# Altium footprint library PcbLib_Discrete_ThroughHole.PcbLib: 104 footprints (part 6 of 7)
Each footprint in its own frame and in the unit in brackets; x right, y up, seen from the top. Pads: shape width x height; smd on the part's side, far side on the other; paste and mask are expansions set on the pad; w line width, h text height; cw(c..) or ccw(c..) is an arc to the next point about the centre after c.
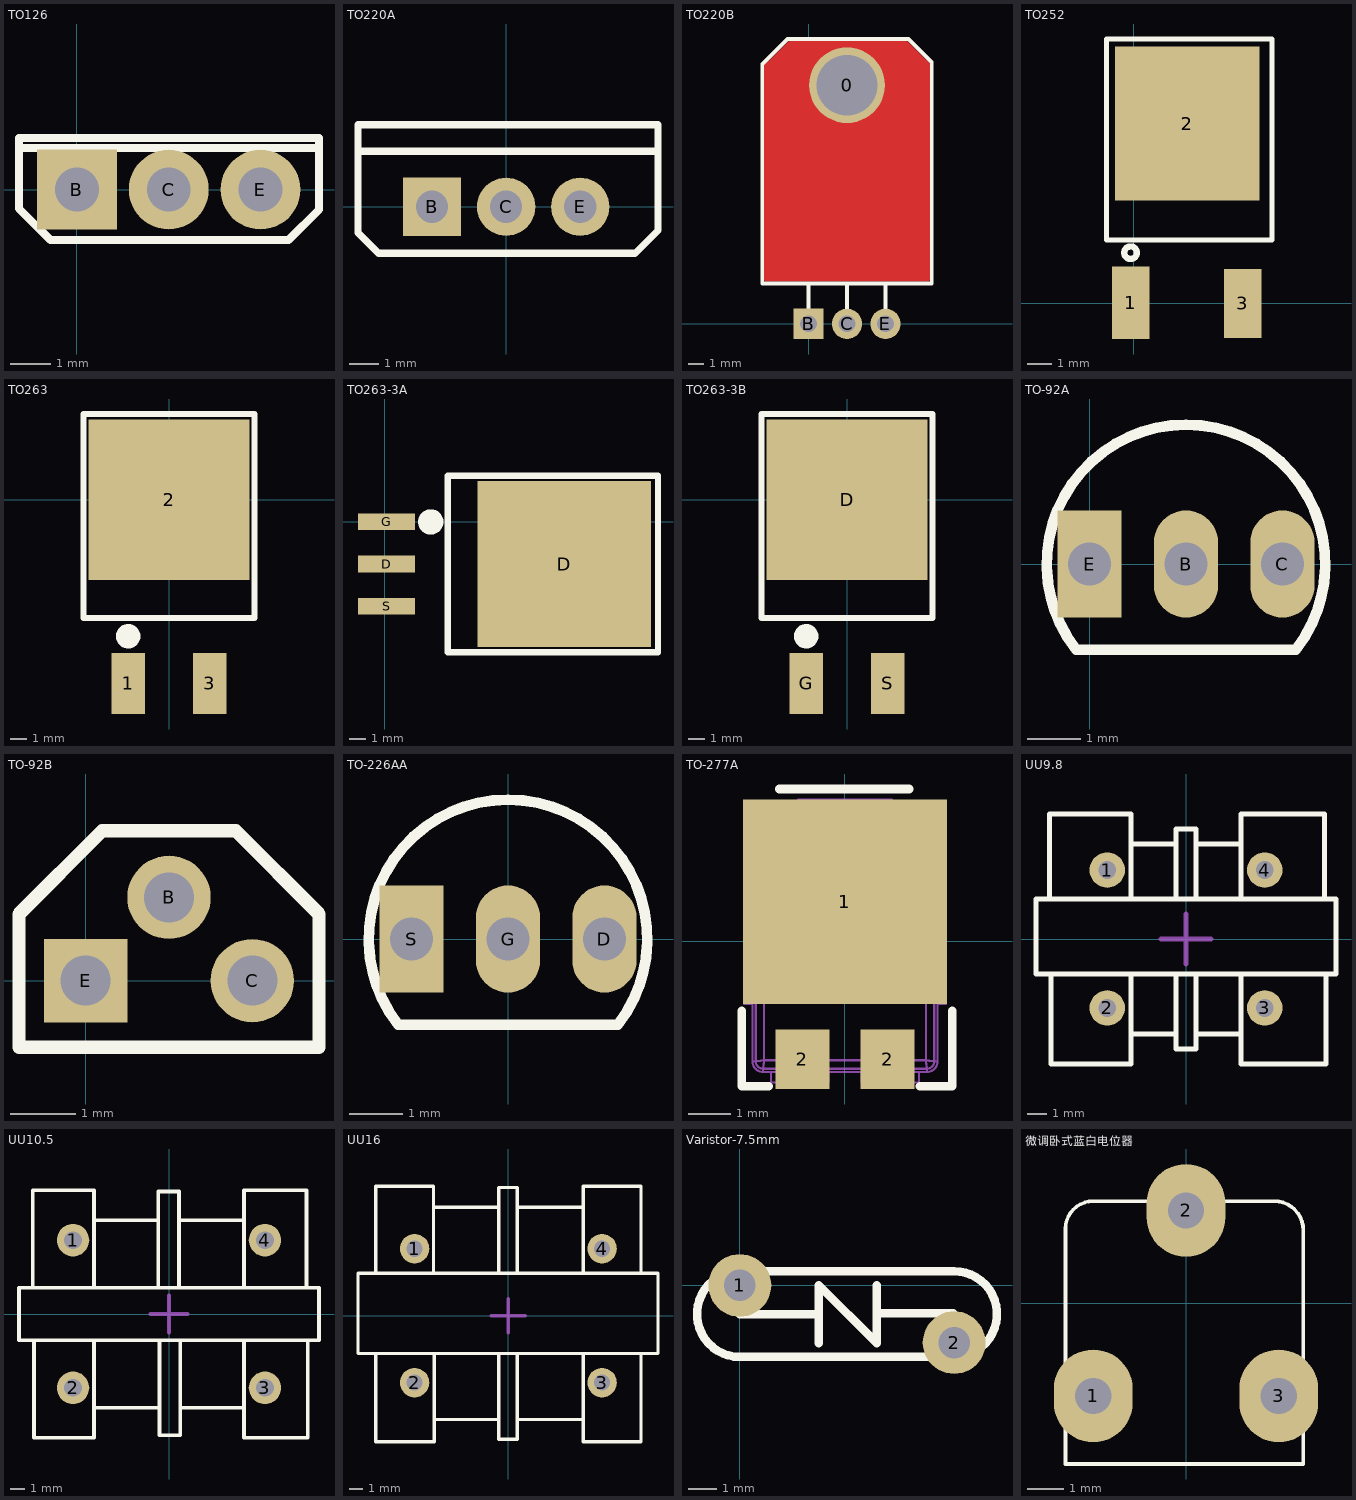
[diagram p5: the footprints below, top view; thin cyan lines are the x and y axes]

## TO126 [mm] "126晶体管"
pads (3):
  rect 2x2 hole 1.1: B(0,0)
  round 2 hole 1.1: C(2.3,0) E(4.6,0)
Top Overlay:
  lines w0.2: -1.434,1.041 6.034,1.041 ; -1.452,-0.48 -0.664,-1.268 5.305,-1.268 6.067,-0.506 6.067,1.295 -1.452,1.295 -1.452,-0.48
3D body "23.STEP": height 15, standoff -4, extent -1.7,-1.27 6.3,1.53

## TO220A [mm] "220，3脚晶体管"
pads (3):
  rect 2x2 hole 1.1: B(-2.54,0)
  round 2 hole 1.1: C(0,0) E(2.54,0)
Top Overlay:
  lines w0.254: -4.928,1.905 5.131,1.905 ; -5.08,-0.889 -4.369,-1.6 4.42,-1.6 5.207,-0.813 5.207,2.819 -5.08,2.819 -5.08,-0.889
3D body "4.STEP": height 18.5, standoff -4, extent -5.08,-1.453 5.22,2.977

## TO220B [mm] "220，3脚晶体管"
pads (4):
  round 5 hole 4: 0(2.54,15.748)
  rect 2x2 hole 1.1: B(0,0)
  round 2 hole 1.1: C(2.54,0) E(5.08,0)
Top Layer:
  rectangle: -2.794,2.921 7.874,17.018
  rectangle: -1.27,16.891 6.604,18.542
  rectangle: 6.604,16.891 7.239,17.78
  rectangle: -2.032,16.891 -1.27,17.653
  rectangle: -1.778,17.653 -1.27,18.034
  rectangle: -2.286,17.018 -2.032,17.526
  rectangle: 6.985,16.891 7.683,17.335
  rectangle: 6.35,17.526 6.985,18.034
  lines w0.254: -2.667,16.891 -1.27,18.288 ; -2.286,17.018 -1.27,18.034 ; 6.477,18.288 7.366,17.272 7.874,17.018 7.239,17.526 ; -2.794,2.921 -2.794,16.637 -2.794,17.018 -2.286,17.526 -1.27,18.542 5.969,18.542 6.477,18.542 7.493,17.526 7.874,17.145 7.874,3.429 7.874,2.921 -2.54,2.921 -2.794,2.921
Top Overlay:
  lines w0.254: 0,0.737 0,2.667 ; 2.54,0.711 2.54,2.667 ; 5.08,0.686 5.08,2.667 ; -3.048,2.667 8.128,2.667 8.128,17.272 6.604,18.796 -1.397,18.796 -3.048,17.145 -3.048,2.667
3D body "14.STEP": height 4.43, standoff -3, extent -2.61,-0.254 7.69,18.496

## TO252 [mil] "DPAK"
pads (3):
  rect 60x115 smd: 1(-4.55,0.23)
  rect 230x245 smd: 2(85,285.35)
  rect 60x110 smd: 3(173.45,-0.77)
Top Overlay:
  circle w10: c-5,80 r10
  lines w7.87: -42.95,100 -42.95,147.56 -42.95,420 220,420 220,147.56 220,100 -42.95,100
3D body "DPAK_TO-252.STEP": height 93.31, standoff -1.18, extent -45.11,1.18 220,398.82

## TO263 [mm] "D2PAK"
pads (3):
  rect 2.1x3.8 smd: 1(-2.54,-11.45) 3(2.54,-11.45)
  rect 10x10 smd: 2(0,0)
Top Overlay:
  circle w0.762: c-2.54,-8.509 r0.381
  lines w0.381: -5.334,-7.366 5.334,-7.366 5.334,-5.588 5.334,5.334 -5.334,5.334 -5.334,-5.588 -5.334,-7.366
3D body "1.STEP": height 4.5, standoff 0, extent -4.92,-11.049 5.08,3.881

## TO263-3A [mm]
height 4.5
pads (4):
  rect 3.45x1 smd: D(0.125,-2.54) G(0.125,0) S(0.125,-5.08)
  rect 10.5x10 smd: D(10.85,-2.54)
Top Overlay:
  circle w0.762: c2.794,0 r0.381
  lines w0.381: 3.81,-7.874 6.096,-7.874 16.51,-7.874 16.51,2.794 5.842,2.794 3.81,2.794 3.81,-7.874
3D body "TO263-3.STEP": height 4.7, standoff 0, extent 0.66,-7.493 15.088,2.507

## TO263-3B [mm]
pads (3):
  rect 10x10 smd: D(0,0)
  rect 2.1x3.8 smd: G(-2.54,-11.45) S(2.54,-11.45)
Top Overlay:
  circle w0.762: c-2.54,-8.509 r0.381
  lines w0.381: -5.334,-7.366 5.334,-7.366 5.334,-5.588 5.334,5.334 -5.334,5.334 -5.334,-5.588 -5.334,-7.366
3D body "1.STEP": height 4.5, standoff 0, extent -4.92,-11.049 5.08,3.881

## TO-92A [mm]
height 5.33
pads (3):
  oval 1.2x2 hole 0.8: B(1.8,0) C(3.6,0)
  rect 1.2x2 hole 0.8: E(0,0)
Top Overlay:
  lines w0.2: -0.249,-1.601 cw(c1.8,0) 3.849,-1.601 ; -0.19,-1.6 3.79,-1.6
3D body "5.STEP": height 6.58, standoff -4.02, extent -0.5,-1.314 4.1,2.286

## TO-92B [mil]
pads (3):
  round 50 hole 30: B(50,50) C(100,0)
  rect 50x50 hole 30: E(0,0)
Top Overlay:
  lines w8: -40,-40 -40,40 10,90 90,90 140,40 140,-40 -40,-40
3D body "TO92.STEP": height 283.41, standoff -133.91, extent -40.55,-50 140.55,91.54

## TO-226AA [mm] "TO-92A"
height 5.33
pads (3):
  oval 1.2x2 hole 0.8: D(1.8,0) G(0,0)
  rect 1.2x2 hole 0.8: S(-1.8,0)
Top Overlay:
  lines w0.2: -2.049,-1.601 cw(c0,0) 2.049,-1.601 ; -1.99,-1.6 1.99,-1.6
3D body "5.STEP": height 6.58, standoff -4.02, extent -2.3,-1.314 2.3,2.286

## TO-277A [mm]
pads (3):
  rect 4.8x4.8 smd: 1(0,0.925)
  rect 1.27x1.4 smd: 2(-1,-2.775) 2(1,-2.775)
Top Overlay:
  lines w0.2: -2.429,-1.632 -2.429,-3.41 -1.794,-3.41 ; -1.54,3.575 1.508,3.575 ; 1.762,-3.41 2.524,-3.41 2.524,-1.632
Top Assembly:
  lines w0.05: -2.175,-1.475 -2.375,-1.475 -2.375,-0.725 -2.175,-0.725 ; -1.74,-3.075 -1.74,-3.325 -0.39,-3.325 -0.39,-3.075 ; -1.1,3.075 -1.1,3.325 1.1,3.325 1.1,3.075 ; 0.39,-3.075 0.39,-3.325 1.74,-3.325 1.74,-3.075 ; 2.175,-1.475 2.375,-1.475 2.375,-0.725 2.175,-0.725 ; -2.175,-2.825 ccw(c-1.925,-2.825) -1.925,-3.075 ; -2.175,-2.825 -2.175,2.825 ; -2.175,-2.825 -2.098,-2.825 ; -2.175,2.825 cw(c-1.925,2.825) -1.925,3.075 ; -2.175,2.825 -2.098,2.825 ; -2.098,-2.825 ccw(c-1.922,-2.822) -1.925,-2.998 ; -2.098,-2.825 -2.098,2.825 ; -2.098,-2.825 -2.091,-2.824 -2.078,-2.822 -2.069,-2.821 -2.058,-2.82 -2.046,-2.818 -2.032,-2.817 -2.011,-2.814 -1.981,-2.81 -1.944,-2.805 -1.9,-2.8 ; -2.098,2.825 cw(c-1.922,2.822) -1.925,2.998 ; -2.098,2.825 -2.091,2.824 -2.078,2.822 -2.069,2.821 -2.058,2.82 -2.046,2.818 -2.032,2.817 -2.011,2.814 -1.981,2.81 -1.944,2.805 -1.9,2.8 ; -1.925,-3.075 1.925,-3.075 ; -1.925,-3.075 -1.925,-2.998 ; -1.925,-2.998 1.925,-2.998 ; -1.925,-2.998 -1.924,-2.991 -1.922,-2.978 -1.921,-2.965 -1.919,-2.95 -1.917,-2.932 -1.914,-2.911 -1.91,-2.881 -1.905,-2.844 -1.9,-2.8 ; -1.925,2.998 1.925,2.998 ; -1.925,2.998 -1.924,2.991 -1.922,2.978 -1.921,2.969 -1.92,2.958 -1.918,2.946 -1.917,2.932 -1.914,2.911 -1.91,2.881 -1.905,2.844 -1.9,2.8 ; -1.925,2.998 -1.925,3.075 ; -1.925,3.075 1.925,3.075 ; -1.9,-2.8 1.9,-2.8 ; -1.9,-2.8 -1.9,2.8 ; -1.9,2.8 1.9,2.8 ; 1.9,-2.8 1.944,-2.805 1.981,-2.81 2.011,-2.814 2.032,-2.817 2.05,-2.819 2.065,-2.821 2.078,-2.822 2.091,-2.824 2.098,-2.825 ; 1.9,-2.8 1.905,-2.844 1.91,-2.881 1.914,-2.911 1.917,-2.932 1.919,-2.95 1.921,-2.965 1.922,-2.978 1.924,-2.991 1.925,-2.998 ; 1.9,-2.8 1.9,2.8 ; 1.9,2.8 1.905,2.844 1.91,2.881 1.914,2.911 1.917,2.932 1.918,2.946 1.92,2.958 1.921,2.969 1.922,2.978 1.924,2.991 1.925,2.998 ; 1.9,2.8 1.944,2.805 1.981,2.81 2.011,2.814 2.032,2.817 2.05,2.819 2.065,2.821 2.078,2.822 2.091,2.824 2.098,2.825 ; 1.925,-3.075 ccw(c1.925,-2.825) 2.175,-2.825 ; 1.925,-3.075 1.925,-2.998 ; 1.925,-2.998 ccw(c1.922,-2.822) 2.098,-2.825 ; 1.925,2.998 cw(c1.922,2.822) 2.098,2.825 ; 1.925,2.998 1.925,3.075 ; 1.925,3.075 cw(c1.925,2.825) 2.175,2.825 ; 2.098,-2.825 2.098,2.825 ; 2.098,-2.825 2.175,-2.825 ; 2.098,2.825 2.175,2.825 ; 2.175,-2.825 2.175,2.825
  text ".Designator" at 0.466,-3.444 h2
3D body "TO-277A.step": height 1.2, standoff 0, extent -2.375,-3.325 2.375,3.325

## UU9.8 [mm] "17*12*17mm(长宽高）"
pads (4):
  round 1.8 hole 0.9: 1(-4,3.5) 2(-4,-3.5) 3(4,-3.5) 4(4,3.5)
Top Overlay:
  lines w0.254: -6.943,2.032 -6.943,6.35 -2.794,6.35 -2.794,2.032 ; -6.858,-1.778 -6.858,-6.35 -2.794,-6.35 -2.794,-1.778 ; -2.794,-4.826 -0.638,-4.826 ; -2.794,4.826 -0.508,4.826 ; -0.508,-1.778 -0.508,-5.588 0.508,-5.588 0.508,-1.778 ; -0.508,2.032 -0.508,5.588 0.508,5.588 0.508,2.032 ; 0.508,-4.826 2.794,-4.826 ; 0.508,4.826 2.794,4.826 ; 2.794,-1.778 2.794,-6.35 7.112,-6.35 7.112,-1.778 ; 2.794,2.032 2.794,6.35 7.027,6.35 7.027,2.032 ; -7.62,-1.778 7.62,-1.778 7.62,2.032 -7.62,2.032 -7.62,-1.778
Mechanical 15:
  lines w0.254: -1.27,0 1.27,0 ; 0,-1.27 0,1.27
3D body "UU9.8.STEP": height 17.05, standoff -3.45, extent -8.491,-6 8.509,6

## UU10.5 [mm] "18*16*20mm(长宽高）"
pads (4):
  round 2.2 hole 1.2: 1(-6.5,5) 2(-6.5,-5) 3(6.5,-5) 4(6.5,5)
Top Overlay:
  lines w0.254: -9.229,1.904 -9.229,8.382 -5.08,8.382 -5.08,1.904 ; -9.144,-1.81 -9.144,-8.382 -5.08,-8.382 -5.08,-1.81 ; -5.08,-6.35 -0.638,-6.35 ; -5.08,6.35 -0.723,6.35 ; -0.723,1.904 -0.723,8.304 0.677,8.304 0.677,1.904 ; -0.638,-1.81 -0.638,-8.21 0.762,-8.21 0.762,-1.81 ; 0.677,6.35 5.08,6.35 ; 0.762,-6.35 5.08,-6.35 ; 5.08,-1.904 5.08,-8.382 9.398,-8.382 9.398,-1.904 ; 5.08,1.904 5.08,8.382 9.313,8.382 9.313,1.904 ; -10.16,-1.778 10.16,-1.778 10.16,1.778 -10.16,1.778 -10.16,-1.778
Mechanical 15:
  lines w0.254: -1.27,0 1.27,0 ; 0,-1.27 0,1.27
3D body "UU10.5.STEP": height 21.05, standoff -3.45, extent -9.398,-8 9.402,8

## UU16 [mm] "22*17.5*23mm(长宽高）"
pads (4):
  round 2.2 hole 1.2: 1(-7,5) 2(-7,-5) 3(7,-5) 4(7,5)
Top Overlay:
  lines w0.254: -9.906,-2.826 -9.906,-9.398 -5.523,-9.398 -5.523,-2.826 ; -9.906,3.174 -9.906,9.652 -5.588,9.652 -5.588,3.174 ; -5.523,-7.749 -0.723,-7.749 ; -5.523,8.097 -0.723,8.097 ; -0.723,-2.826 -0.723,-9.226 0.677,-9.226 0.677,-2.826 ; -0.723,3.174 -0.723,9.574 0.677,9.574 0.677,3.174 ; 0.677,-7.749 5.477,-7.749 ; 0.677,8.097 5.477,8.097 ; 5.588,-2.92 5.588,-9.398 9.906,-9.398 9.906,-2.92 ; 5.588,3.174 5.588,9.652 9.906,9.652 9.906,3.174 ; -11.223,-2.826 11.177,-2.826 11.177,3.174 -11.223,3.174 -11.223,-2.826
Mechanical 15:
  lines w0.254: -1.27,0 1.27,0 ; 0,-1.27 0,1.27
3D body "UU16.STEP": height 22.05, standoff -3.45, extent -11.049,-8.75 10.951,8.75

## Varistor-7.5mm [mm]
pads (2):
  round 2.2 hole 1.1: 1(0,0) 2(7.5,-2)
Top Overlay:
  lines w0.3: 0,-1.003 2.625,-1.003 ; 2.757,-2.019 2.757,0.013 4.789,-2.019 4.789,0.013 ; 4.825,-0.978 7.475,-0.978 ; 0,-2.503 cw(c0,-1.003) 0,0.497 7.5,0.497 cw(c7.5,-1.003) 7.5,-2.503 0,-2.503
3D body "10D471K.STEP": height 11.2, standoff -4, extent -1.6,-2.8 9.1,0.8

## 微调卧式蓝白电位器 [mil]
pads (3):
  oval 85x100 hole 39: 1(-100,-100) 2(0,100) 3(100,-100)
Top Overlay:
  lines w3.94: -130,-173.46 -130,80 cw(c-100,80) -100,110 95,110 cw(c95,78.46) 126.54,78.46 126.54,-173.46 -130,-173.46
3D body "User Library-Trimmer, 3306F-1.STEP": height 300, standoff -119.49, extent -134.05,-191.98 134.06,132.89